# Altium footprint library Altium_Lib.PcbLib: 334 footprints (part 20 of 21)
Each footprint in its own frame and in the unit in brackets; x right, y up, seen from the top. Pads: shape width x height; smd on the part's side, far side on the other; paste and mask are expansions set on the pad; w line width, h text height; cw(c..) or ccw(c..) is an arc to the next point about the centre after c.
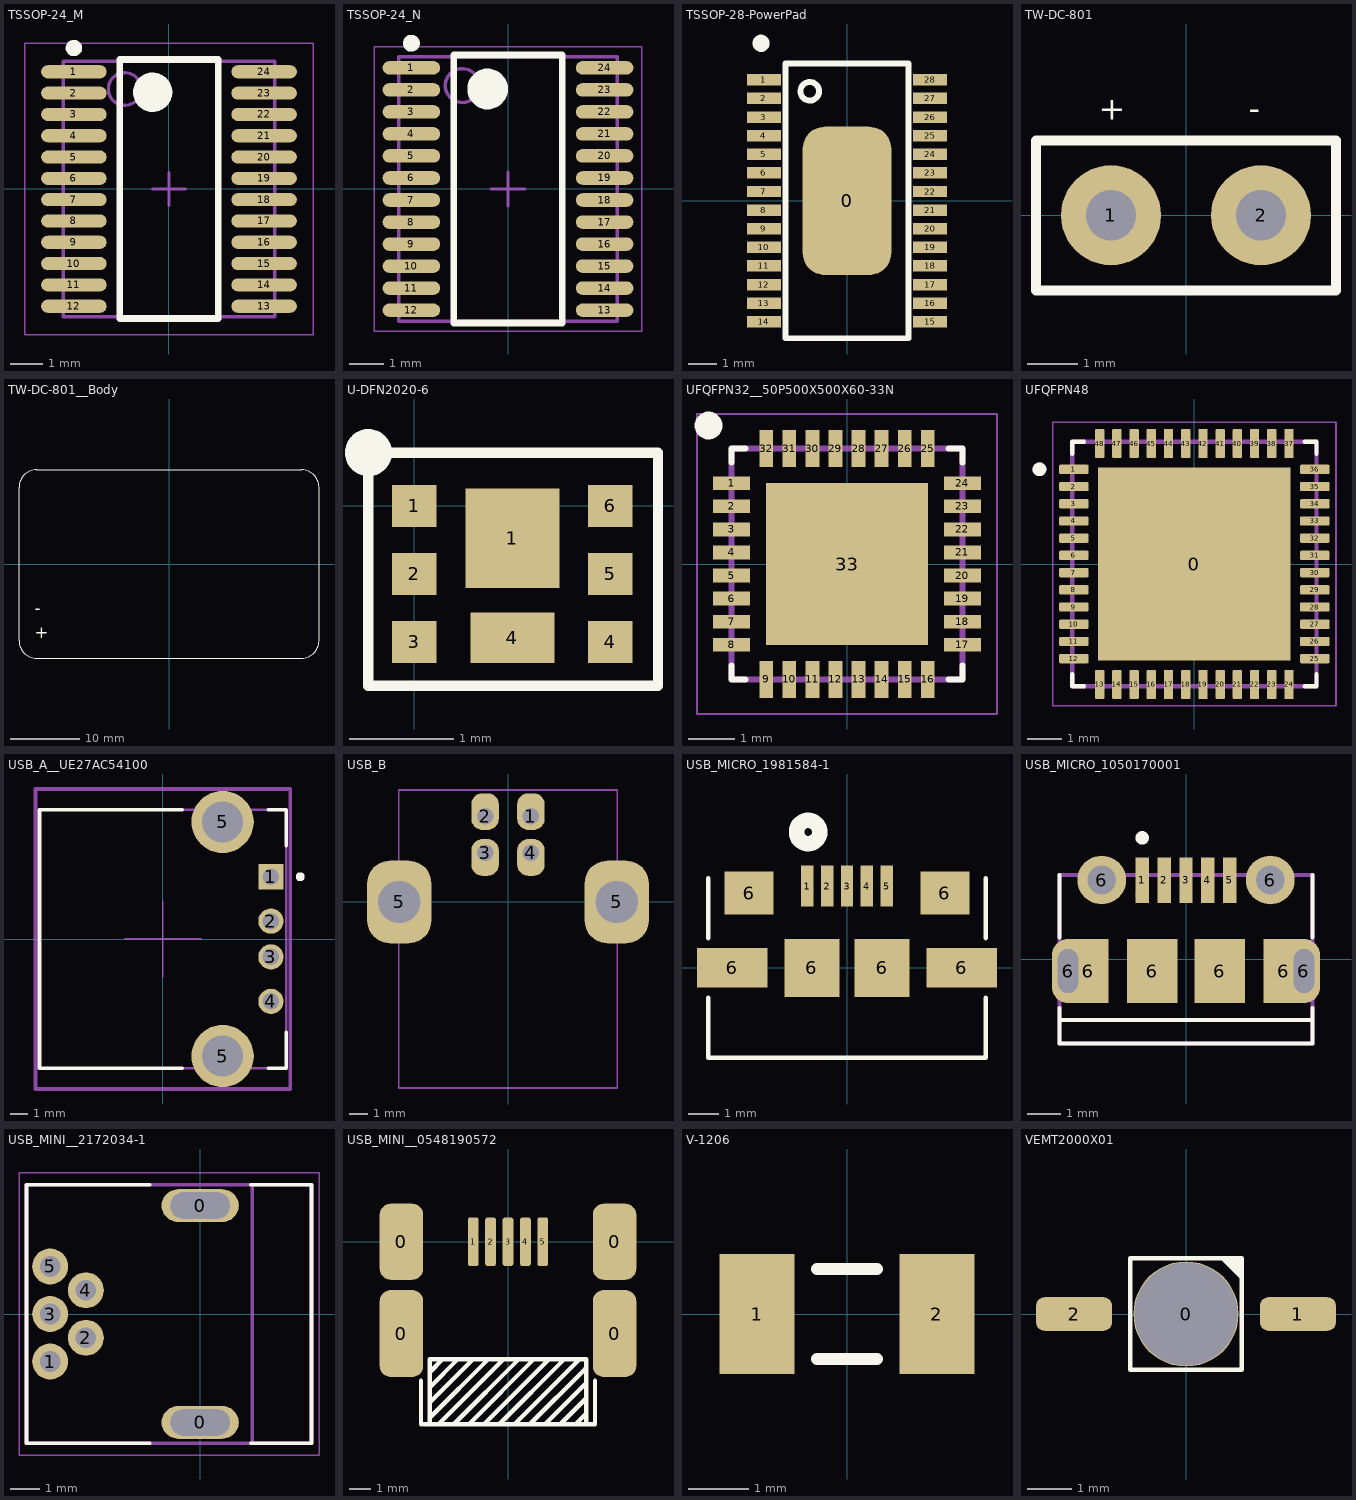
[diagram p19: the footprints below, top view; thin cyan lines are the x and y axes]

## TSSOP-24_M [mm] "TSOP, 24-Leads, Body 7,80x4,40mm, Pitch 0,65mm, IPC Low Density"
height 1.2
pads (24):
  oval 2x0.4 smd: 1(-2.9,3.575) 2(-2.9,2.925) 3(-2.9,2.275) 4(-2.9,1.625) 5(-2.9,0.975) 6(-2.9,0.325) 7(-2.9,-0.325) 8(-2.9,-0.975) 9(-2.9,-1.625) 10(-2.9,-2.275) 11(-2.9,-2.925) 12(-2.9,-3.575) 13(2.9,-3.575) 14(2.9,-2.925) 15(2.9,-2.275) 16(2.9,-1.625) 17(2.9,-0.975) 18(2.9,-0.325) 19(2.9,0.325) 20(2.9,0.975) 21(2.9,1.625) 22(2.9,2.275) 23(2.9,2.925) 24(2.9,3.575)
Top Overlay:
  circle w0.25: c-2.9,4.3 r0.125
  circle w0.6: c-0.5,2.95 r0.3
  lines w0.2: -1.5,-3.95 -1.5,3.95 1.5,3.95 1.5,-3.95 -1.5,-3.95
Mechanical 13:
  circle w0.1: c-1.35,3.05 r0.5
  lines w0.1: -3.228,-3.9 -3.228,3.9 3.228,3.9 3.228,-3.9 -3.228,-3.9
Mechanical 15:
  lines w0.05: -4.4,-4.45 -4.4,4.45 4.4,4.45 4.4,-4.45 -4.4,-4.45
  lines w0.1: -0.5,0 0.5,0 ; 0,-0.5 0,0.5
3D body "TSSOP_24_065p.step": height 1.2, standoff 0, extent -3.228,-3.9 3.228,3.9

## TSSOP-24_N [mm] "TSOP, 24-Leads, Body 7,80x4,40mm, Pitch 0,65mm, IPC Medium Density"
height 1.2
pads (24):
  oval 1.7x0.4 smd: 1(-2.85,3.575) 2(-2.85,2.925) 3(-2.85,2.275) 4(-2.85,1.625) 5(-2.85,0.975) 6(-2.85,0.325) 7(-2.85,-0.325) 8(-2.85,-0.975) 9(-2.85,-1.625) 10(-2.85,-2.275) 11(-2.85,-2.925) 12(-2.85,-3.575) 13(2.85,-3.575) 14(2.85,-2.925) 15(2.85,-2.275) 16(2.85,-1.625) 17(2.85,-0.975) 18(2.85,-0.325) 19(2.85,0.325) 20(2.85,0.975) 21(2.85,1.625) 22(2.85,2.275) 23(2.85,2.925) 24(2.85,3.575)
Top Overlay:
  circle w0.25: c-2.85,4.3 r0.125
  circle w0.6: c-0.6,2.95 r0.3
  lines w0.2: -1.6,-3.95 -1.6,3.95 1.6,3.95 1.6,-3.95 -1.6,-3.95
Mechanical 13:
  circle w0.1: c-1.35,3.05 r0.5
  lines w0.1: -3.228,-3.9 -3.228,3.9 3.228,3.9 3.228,-3.9 -3.228,-3.9
Mechanical 15:
  lines w0.05: -3.95,-4.2 -3.95,4.2 3.95,4.2 3.95,-4.2 -3.95,-4.2
  lines w0.1: -0.5,0 0.5,0 ; 0,-0.5 0,0.5
3D body "TSSOP_24_065p.step": height 1.2, standoff 0, extent -3.228,-3.9 3.228,3.9

## TSSOP-28-PowerPad [mm]
pads (29):
  rrect50% 3.1x5.18 smd: 0(0,0)
  rect 1.2x0.4 smd: 1(-2.9,4.225) 2(-2.9,3.575) 3(-2.9,2.925) 4(-2.9,2.275) 5(-2.9,1.625) 6(-2.9,0.975) 7(-2.9,0.325) 8(-2.9,-0.325) 9(-2.9,-0.975) 10(-2.9,-1.625) 11(-2.9,-2.275) 12(-2.9,-2.925) 13(-2.9,-3.575) 14(-2.9,-4.225) 15(2.9,-4.225) 16(2.9,-3.575) 17(2.9,-2.925) 18(2.9,-2.275) 19(2.9,-1.625) 20(2.9,-0.975) 21(2.9,-0.325) 22(2.9,0.325) 23(2.9,0.975) 24(2.9,1.625) 25(2.9,2.275) 26(2.9,2.925) 27(2.9,3.575) 28(2.9,4.225)
Top Overlay:
  circle w0.203: c-1.3,3.825 r0.325
  circle w0.3: c-3,5.5 r0.15
  lines w0.203: -2.15,-4.8 -2.15,4.8 2.15,4.8 2.15,-4.8 -2.15,-4.8
3D body "DRV8825PWP--3DModel-STEP-56544.STEP": height 1.25, standoff 0.05, extent -3.2,-4.85 3.2,4.85

## TW-DC-801 [mm]
pads (2):
  round 2 hole 1: 1(-1.5,0) 2(1.5,0)
Top Overlay:
  lines w0.2: -3,-1.5 3,-1.5 3,1.5 -3,1.5 -3,-1.5
  text "-" at 1.25,1.75 h0.8
  text "+" at -1.75,1.75 h0.8

## TW-DC-801__Body [mm]
Top Overlay:
  lines w0.1: -21.5,-11 ccw(c-19,-11) -19,-13.5 19,-13.5 ccw(c19,-11) 21.5,-11 21.5,11 ccw(c19,11) 19,13.5 -19,13.5 ccw(c-19,11) -21.5,11 -21.5,-11
  text "+" at -19.25,-11.25 h3
  text "-" at -19.25,-7.75 h3
3D body "TW-DC-801.STEP": height 18.2, standoff 0.2, extent -26.5,-13.6 26.5,13.4

## U-DFN2020-6 [mm]
height 0.75
pads (8):
  rect 0.425x0.4 smd: 1(0,0) 2(0,-0.65) 3(0,-1.3) 4(1.875,-1.3) 5(1.875,-0.65) 6(1.875,0)
  rect 0.9x0.95 smd: 1(0.937,-0.31)
  rect 0.8x0.48 smd: 4(0.937,-1.26)
Top Overlay:
  circle w0.25: c-0.44,0.51 r0.1
  lines w0.1: -0.44,-1.72 2.33,-1.72 2.33,0.51 -0.44,0.51 -0.44,-1.72
3D body "UDFN6B_z90.stp": height 0.77, standoff 0, extent -0.06,-1.65 1.94,0.35

## UFQFPN32__50P500X500X60-33N [mm]
pads (33):
  rect 0.8x0.3 smd mask+0.05: 1(-2.5,1.75) 2(-2.5,1.25) 3(-2.5,0.75) 4(-2.5,0.25) 5(-2.5,-0.25) 6(-2.5,-0.75) 7(-2.5,-1.25) 8(-2.5,-1.75) 17(2.5,-1.75) 18(2.5,-1.25) 19(2.5,-0.75) 20(2.5,-0.25) 21(2.5,0.25) 22(2.5,0.75) 23(2.5,1.25) 24(2.5,1.75)
  rect 0.3x0.8 smd mask+0.05: 9(-1.75,-2.5) 10(-1.25,-2.5) 11(-0.75,-2.5) 12(-0.25,-2.5) 13(0.25,-2.5) 14(0.75,-2.5) 15(1.25,-2.5) 16(1.75,-2.5) 25(1.75,2.5) 26(1.25,2.5) 27(0.75,2.5) 28(0.25,2.5) 29(-0.25,2.5) 30(-0.75,2.5) 31(-1.25,2.5) 32(-1.75,2.5)
  rect 3.5x3.5 smd: 33(0,0)
Top Overlay:
  circle w0.3: c-3,3 r0.15
  lines w0.127: -2.5,-2.2 -2.5,-2.5 -2.2,-2.5 ; -2.5,2.2 -2.5,2.5 -2.2,2.5 ; 2.2,-2.5 2.5,-2.5 2.5,-2.2 ; 2.2,2.5 2.5,2.5 2.5,2.2
Top Paste:
  region: -1.103,1.1 1.1,1.1 1.1,-1.103 -1.103,-1.103
Mechanical 4:
  lines w0.127: -2.5,-2.5 2.5,-2.5 ; -2.5,-2.5 -2.5,2.5 ; -2.5,-2.5 2.5,-2.5 ; -2.5,-2.5 -2.5,2.5 ; -2.5,2.5 2.5,2.5 ; -2.5,2.5 2.5,2.5 ; 2.5,-2.5 2.5,2.5 ; 2.5,-2.5 2.5,2.5
Mechanical 16:
  lines w0.05: -3.25,-3.25 3.25,-3.25 3.25,3.25 -3.25,3.25 -3.25,-3.25
3D body "User Library-UFQFPN-32.STEP": height 0.55, standoff 0, extent -2.5,-2.5 2.5,2.5

## UFQFPN48 [mm]
pads (49):
  rect 5.6x5.6 smd paste-4: 0(0,0)
  rrect25% 0.85x0.27 smd: 1(-3.5,2.75) 2(-3.5,2.25) 3(-3.5,1.75) 4(-3.5,1.25) 5(-3.5,0.75) 6(-3.5,0.25) 7(-3.5,-0.25) 8(-3.5,-0.75) 9(-3.5,-1.25) 10(-3.5,-1.75) 11(-3.5,-2.25) 12(-3.5,-2.75) 25(3.5,-2.75) 26(3.5,-2.25) 27(3.5,-1.75) 28(3.5,-1.25) 29(3.5,-0.75) 30(3.5,-0.25) 31(3.5,0.25) 32(3.5,0.75) 33(3.5,1.25) 34(3.5,1.75) 35(3.5,2.25) 36(3.5,2.75)
  rrect25% 0.27x0.85 smd: 13(-2.75,-3.5) 14(-2.25,-3.5) 15(-1.75,-3.5) 16(-1.25,-3.5) 17(-0.75,-3.5) 18(-0.25,-3.5) 19(0.25,-3.5) 20(0.75,-3.5) 21(1.25,-3.5) 22(1.75,-3.5) 23(2.25,-3.5) 24(2.75,-3.5) 37(2.75,3.5) 38(2.25,3.5) 39(1.75,3.5) 40(1.25,3.5) 41(0.75,3.5) 42(0.25,3.5) 43(-0.25,3.5) 44(-0.75,3.5) 45(-1.25,3.5) 46(-1.75,3.5) 47(-2.25,3.5) 48(-2.75,3.5)
Top Overlay:
  circle w0.2: c-4.5,2.75 r0.1
  lines w0.127: -3.55,-3.205 -3.55,-3.55 -3.205,-3.55 ; -3.55,3.205 -3.55,3.55 -3.205,3.55 ; 3.205,-3.55 3.55,-3.55 3.55,-3.205 ; 3.205,3.55 3.55,3.55 3.55,3.205
Top Paste:
  region: -1.21,-2.53 -2.53,-2.53 -2.53,-1.21 -1.21,-1.21
  region: 0.66,-2.53 -0.66,-2.53 -0.66,-1.21 0.66,-1.21
  region: 2.53,-2.53 1.21,-2.53 1.21,-1.21 2.53,-1.21
  region: 2.53,1.21 1.21,1.21 1.21,2.53 2.53,2.53
  region: 0.66,1.21 -0.66,1.21 -0.66,2.53 0.66,2.53
  region: -1.21,1.21 -2.53,1.21 -2.53,2.53 -1.21,2.53
  region: 2.53,-0.66 1.21,-0.66 1.21,0.66 2.53,0.66
  region: -1.21,-0.66 -2.53,-0.66 -2.53,0.66 -1.21,0.66
  region: 0.66,-0.66 -0.66,-0.66 -0.66,0.66 0.66,0.66
Mechanical 13:
  circle w0.2: c-4.5,2.75 r0.1
  lines w0.127: -3.55,-3.55 3.55,-3.55 3.55,3.55 -3.55,3.55 -3.55,-3.55
Mechanical 15:
  lines w0.05: -4.115,-4.115 4.115,-4.115 4.115,4.115 -4.115,4.115 -4.115,-4.115
3D body "STM32L452CCU6.STEP": height 0.6, standoff 0, extent -3.5,-3.5 3.5,3.5

## USB_A__UE27AC54100 [mm]
pads (6):
  rect 1.42x1.42 hole 0.92 paste-1000 mask+0: 1(6.065,3.5)
  round 1.42 hole 0.92 paste-1000 mask+0: 2(6.065,1) 3(6.065,-1) 4(6.065,-3.5)
  round 3.5 hole 2.3 paste-1000 mask+0: 5(3.355,-6.57) 5(3.355,6.57)
Top Overlay:
  circle w0.25: c7.715,3.495 r0.125
  lines w0.2: 1.075,-7.25 -6.925,-7.25 -6.925,7.25 1.075,7.25 ; 5.925,-7.25 6.925,-7.25 6.925,-5.25 ; 5.925,7.25 6.925,7.25 6.925,5.25
Mechanical 10:
  lines w0.2: -7.15,-8.42 -7.15,8.42 7.15,8.42 7.15,-8.42 -7.15,-8.42
  text ".Designator" at 0,0 h1
Mechanical 12:
  lines w0.15: -6.925,-7.25 -6.925,7.25 6.925,7.25 6.925,-7.25 -6.925,-7.25
Mechanical 15:
  lines w0.1: -2.145,0 2.145,0 ; 0,-2.145 0,2.145
  lines w0.2: -7.15,-8.42 -7.15,8.42 7.15,8.42 7.15,-8.42 -7.15,-8.42
3D body "3dmodel.step": height 0.25, standoff 0, extent -7.15,-8.42 7.15,8.42

## USB_B [mil]
pads (6):
  rrect80% 60x80 hole 36 copper offset 0,10 mask+0: 1(50,187) 2(-50,187)
  rrect80% 60x80 hole 36 copper offset 0,-10 mask+0: 3(-50,107) 4(50,107)
  rrect70% 140x180 hole 92 mask+0: 5(-237,0) 5(237,0)
Mechanical 13:
  lines w3.94: -238.19,-405.51 -238.19,244.09 238.19,244.09 238.19,-405.51 -238.19,-405.51
3D body "USB_B_THD.STEP": height 433.07, standoff -143.42, extent -291.27,-405.51 291.27,244.1

## USB_MICRO_1981584-1 [mil]
pads (11):
  rect 16x53 smd: 1(-51.18,105.39) 2(-25.59,105.39) 3(0,105.39) 4(25.59,105.39) 5(51.18,105.39)
  rect 91x51 smd: 6(-147.64,0) 6(147.64,0)
  rect 63x55 smd: 6(-125.98,96.46) 6(125.98,96.46)
  rect 71x75 smd: 6(-45.28,0) 6(45.28,0)
Top Overlay:
  circle w20: c-50,175 r15
  lines w6: -178.5,-38.6 -178.5,-115.5 178.5,-115.5 178.5,-38.6 ; -178.5,38.6 -178.5,115.5 ; 178.5,38.6 178.5,115.5
Bottom Overlay:
  circle w20: c-50,175 r15
3D body "c-1981584-1-f-3d.stp": height 108.46, standoff -11.61, extent -173.23,-108.27 173.23,112.21

## USB_MICRO_1050170001 [mm]
pads (13):
  rect 0.4x1.35 smd: 1(-1.3,2.35) 2(-0.65,2.35) 3(0,2.35) 4(0.65,2.35) 5(1.3,2.35)
  oval 0.95x1.9 hole 0.6 slot 1.3 at 90 deg: 6(-3.5,-0.35) 6(3.5,-0.35)
  rect 1.2x1.9 smd: 6(-2.9,-0.35) 6(2.9,-0.35)
  round 1.45 hole 0.85: 6(-2.5,2.35) 6(2.5,2.35)
  rect 1.5x1.9 smd: 6(-1,-0.35) 6(1,-0.35)
Top Overlay:
  circle w0.2: c-1.3,3.6 r0.1
  lines w0.127: -3.75,-1.8 3.75,-1.8 ; -3.75,-1.45 -3.75,-2.5 3.75,-2.5 3.75,-1.45 ; -3.75,0.65 -3.75,2.5 ; 3.75,0.65 3.75,2.5
Mechanical 13:
  circle w0.2: c-1.3,1.9 r0.1
  lines w0.127: -3.75,-2.5 3.75,-2.5 3.75,-1.8 3.75,2.5 -3.75,2.5 -3.75,-1.8 -3.75,-2.45
Mechanical 15:
  text "PCB EDGE" at 1.75,-2.25 h0.41
3D body "USB_MICRO_1050170001.STEP": height 2.75, standoff -0.73, extent -4,-2.9 4,2.5

## USB_MINI__2172034-1 [mm]
pads (7):
  oval 2.6x1.1 hole 0.9 slot 2 at 0 deg: 0(0,-3.65) 0(0,3.65)
  round 1.208 hole 0.7: 1(-5.05,-1.6) 2(-3.85,-0.8) 3(-5.05,0) 4(-3.85,0.8) 5(-5.05,1.6)
Top Overlay:
  lines w0.127: -1.7,-4.35 -5.85,-4.35 -5.85,4.35 -1.7,4.35 ; 1.7,-4.35 3.75,-4.35 3.75,4.35 1.7,4.35
Mechanical 13:
  circle w0.2: c-5.05,-1.6 r0.2
  lines w0.127: 1.75,-4.35 1.75,4.35 ; 1.75,-4.35 3.75,-4.35 3.75,4.35 1.75,4.35 ; 1.75,-4.35 -5.85,-4.35 -5.85,4.35 1.75,4.35
Mechanical 15:
  lines w0.05: -6.1,-4.75 -6.1,4.75 4,4.75 4,-4.75 -6.1,-4.75
3D body "2172034-1--3DModel-STEP-56544.STEP": height 4.14, standoff -2.8, extent -5.85,-4.35 3.75,4.35

## USB_MINI__0548190572 [mm]
pads (9):
  rrect50% 2x4 smd: 0(-4.9,-4.225) 0(4.9,-4.225)
  rrect50% 2x3.5 smd: 0(-4.9,0) 0(4.9,0)
  rrect50% 0.5x2.25 smd: 1(-1.6,0) 2(-0.8,0) 3(0,0) 4(0.8,0) 5(1.6,0)
Top Overlay:
  lines w0.2: -4,-8.4 -4,-6.4 ; -3.6,-8.4 -3.6,-5.4 3.6,-5.4 3.6,-8.3 ; -3.6,-7.4 -1.6,-5.4 ; -3.6,-6 -3,-5.4 ; -3.55,-8.05 -0.9,-5.4 ; -3.2,-8.4 -0.2,-5.4 ; -2.5,-8.4 0.5,-5.4 ; -1.75,-8.35 1.2,-5.4 ; -1.1,-8.4 1.9,-5.4 ; -0.4,-8.4 2.6,-5.4 2.8,-5.4 ; 0.35,-8.35 3.3,-5.4 ; 1,-8.4 3.55,-5.85 ; 1.7,-8.4 3.6,-6.5 ; 2.4,-8.4 3.6,-7.2 ; 3.1,-8.4 3.6,-7.9 ; 4,-6.4 4,-8.4 -3.9,-8.4 ; -3.9,-8.4 -3.9,-8.4 ; -3.6,-6.7 -2.3,-5.4 -3.6,-6.7
3D body "548190572.stp": height 4.05, standoff 0, extent -4.95,-8.5 4.95,0.5

## V-1206 [mm]
pads (2):
  rect 1.25x2 smd: 1(-1.5,0) 2(1.5,0)
Top Overlay:
  lines w0.2: -0.5,-0.75 0.5,-0.75 ; -0.5,0.75 0.5,0.75
3D body "STEP-WE-VS-1206-rev1.stp": height 1.5, standoff 0, extent -1.6,-0.8 1.6,0.8

## VEMT2000X01 [mm]
pads (3):
  round 2.35 hole 2.3: 0(0,0)
  rrect50% 1.7x0.75 smd: 1(2.5,0) 2(-2.5,0)
Top Overlay:
  region: 0.75,1.25 1.25,0.75 1.25,1.25
  lines w0.1: -1.25,-1.25 1.25,-1.25 1.25,1.25 -1.25,1.25 -1.25,-1.25
3D body "User Library-VSMY2850RG.STEP": height 1.65, standoff -1.12, extent -2.907,-1.15 2.907,1.15